# Altium footprint library Footprints.PcbLib: 105 footprints (part 6 of 7)
Each footprint in its own frame and in the unit in brackets; x right, y up, seen from the top. Pads: shape width x height; smd on the part's side, far side on the other; paste and mask are expansions set on the pad; w line width, h text height; cw(c..) or ccw(c..) is an arc to the next point about the centre after c.
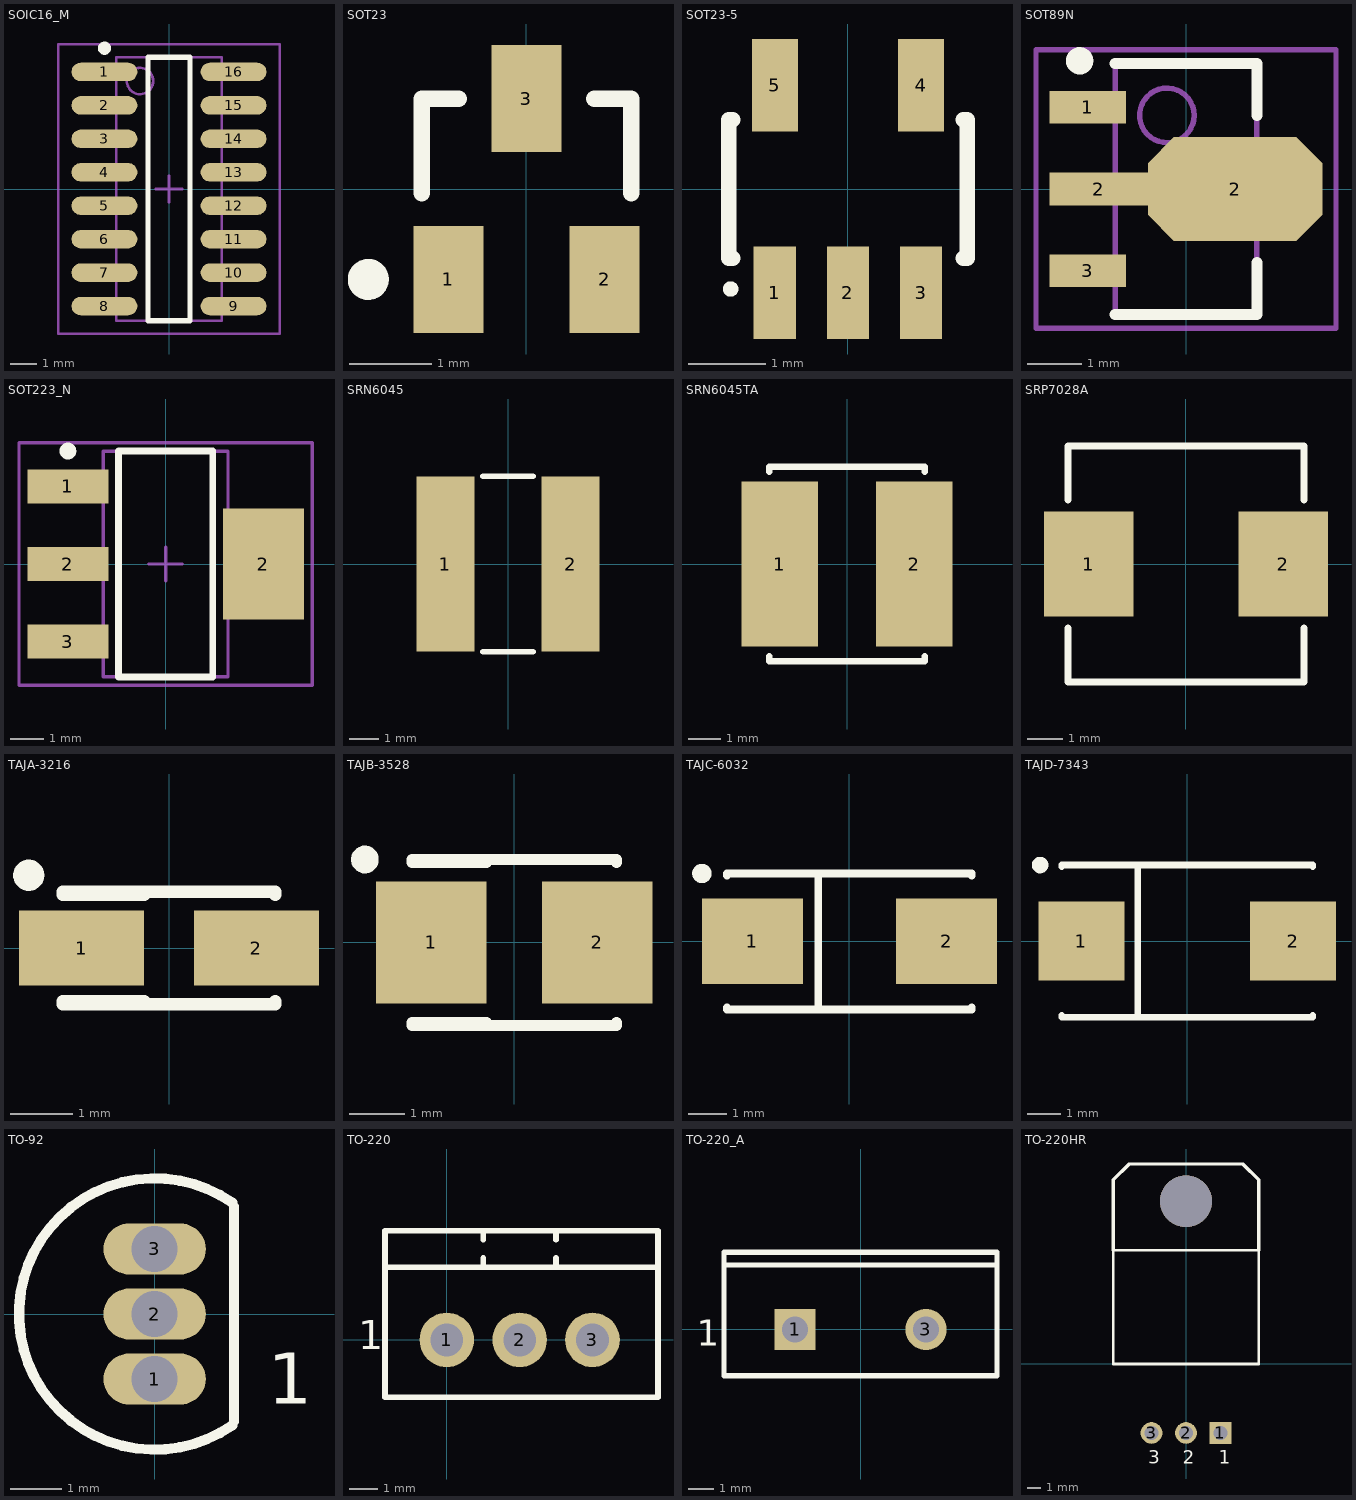
[diagram p5: the footprints below, top view; thin cyan lines are the x and y axes]

## SOIC16_M [mm] "SOIC, 16-Leads, Body 9.9x3.9mm, Pitch 1.27mm, IPC Low Density"
height 1.91
pads (16):
  oval 2.5x0.7 smd: 1(-2.45,4.445) 2(-2.45,3.175) 3(-2.45,1.905) 4(-2.45,0.635) 5(-2.45,-0.635) 6(-2.45,-1.905) 7(-2.45,-3.175) 8(-2.45,-4.445) 9(2.45,-4.445) 10(2.45,-3.175) 11(2.45,-1.905) 12(2.45,-0.635) 13(2.45,0.635) 14(2.45,1.905) 15(2.45,3.175) 16(2.45,4.445)
Top Overlay:
  circle w0.25: c-2.45,5.345 r0.125
  lines w0.2: -0.8,-5 0.8,-5 0.8,5 -0.8,5 -0.8,-5
Mechanical 13:
  circle w0.1: c-1.1,4.1 r0.5
  lines w0.1: -2,-5 2,-5 2,5 -2,5 -2,-5
Mechanical 15:
  lines w0.1: -0.5,0 0.5,0 ; 0,-0.5 0,0.5 ; -4.2,-5.5 4.2,-5.5 4.2,5.5 -4.2,5.5 -4.2,-5.5
3D body: height 1.91, standoff 0, extent -2,-5 2,5

## SOT23 [mm] "SOT-23; 3 Leads; Body 3.0 x 2.6 mm, inc. leads (LxW max)"
height 1.1
pads (3):
  rect 0.85x1.3 smd: 1(-0.95,-1.1) 2(0.95,-1.1) 3(0,1.1)
Top Overlay:
  circle w0.25: c-1.925,-1.1 r0.125
  lines w0.2: -1.275,-0.05 -1.275,1.1 -0.825,1.1 ; 0.825,1.1 1.275,1.1 1.275,-0.05
3D body "SOT-23.STEP": height 1.12, standoff 0.02, extent -1.502,-1.289 1.498,1.211

## SOT23-5 [mm] "SOT-23, 5 Leads; Body 3 x 3 mm, inc. leads (LxW max)"
height 1.1
pads (5):
  rect 0.55x1.2 smd: 1(-0.95,-1.35) 2(0,-1.35) 3(0.95,-1.35)
  rect 0.6x1.2 smd: 4(0.95,1.35) 5(-0.95,1.35)
Top Overlay:
  circle w0.1: c-1.525,-1.3 r0.05
  lines w0.2: -1.5,-0.9 -1.55,-0.9 -1.55,0.9 -1.5,0.9 ; 1.5,-0.9 1.55,-0.9 1.55,0.9 1.5,0.9

## SOT89N [mm] "SOT89, 3-Leads, Body 4.5x2.4 mm, Pitch 1.5mm, Lead Span 4.1mm, IPC Medium Density"
height 1.6
pads (4):
  rect 1.4x0.6 smd: 1(-1.8,1.5) 3(-1.8,-1.5)
  rect 1.8x0.6 smd: 2(-1.6,0)
  oct 3.2x1.9 smd: 2(0.9,0)
Top Overlay:
  circle w0.25: c-1.95,2.35 r0.125
  lines w0.2: -1.3,-2.3 1.3,-2.3 1.3,-1.35 ; -1.3,2.3 1.3,2.3 1.3,1.35
Mechanical 13:
  circle w0.1: c-0.35,1.35 r0.5
  lines w0.1: -1.3,-2.3 1.3,-2.3 1.3,2.3 -1.3,2.3 -1.3,-2.3
Mechanical 15:
  lines w0.1: -0.5,0 0.5,0 ; 0,-0.5 0,0.5 ; -2.75,-2.55 2.75,-2.55 2.75,2.55 -2.75,2.55 -2.75,-2.55
3D body: height 1.6, standoff 0, extent -1.3,-2.3 1.3,2.3

## SOT223_N [mm] "SOT223, 4-Leads, Body 6.5x3.5mm, Pitch 2.3mm, Lead Span 7mm, IPC Medium Density"
height 1.7
pads (4):
  rect 2.4x1 smd: 1(-2.9,2.3) 2(-2.9,0) 3(-2.9,-2.3)
  rect 2.4x3.3 smd: 2(2.9,0)
Top Overlay:
  circle w0.25: c-2.9,3.35 r0.125
  lines w0.2: -1.4,-3.35 -1.4,3.35 1.4,3.35 1.4,-3.35 -1.4,-3.35
Mechanical 13:
  lines w0.1: -1.85,-3.35 -1.85,3.35 1.85,3.35 1.85,-3.35 -1.85,-3.35
Mechanical 15:
  lines w0.1: -0.5,0 0.5,0 ; 0,-0.5 0,0.5 ; -4.35,-3.6 -4.35,3.6 4.35,3.6 4.35,-3.6 -4.35,-3.6
3D body: height 1.7, standoff 0, extent -1.85,-3.35 1.85,3.35

## SRN6045 [mm] "Semi-chielded Power Inductorss"
height 4.5
pads (2):
  rect 2x6 smd: 1(-2.15,0) 2(2.15,0)
Top Overlay:
  lines w0.2: -0.86,-3.01 0.86,-3.01 ; -0.86,3.01 0.86,3.01
3D body "SRN6045.stp": height 4.5, standoff 0, extent -3,-3 3,3

## SRN6045TA [mm]
pads (2):
  rect 2.35x5.1 smd: 1(-2.075,0) 2(2.075,0)
Top Overlay:
  lines w0.2: -2.4,-2.85 -2.4,-3 2.4,-3 2.4,-2.85 ; -2.4,2.85 -2.4,3 2.4,3 2.4,2.85
3D body "SRN6045TA.stp": height 3.95, standoff -0.01, extent -2.997,-2.997 2.997,2.997

## SRP7028A [mm] "Bourns Inductor"
height 2.8
pads (2):
  rect 2.5x2.95 smd: 1(-2.725,0) 2(2.725,0)
Top Overlay:
  lines w0.2: -3.3,-1.8 -3.3,-3.3 3.3,-3.3 3.3,-1.8 ; -3.3,1.8 -3.3,3.3 3.3,3.3 3.3,1.8
3D body "SRP 7028A series.stp": height 2.81, standoff -0.02, extent -3.45,-3.3 3.45,3.3

## TAJA-3216 [mm] "Capacitor, SM Tantalum; Body 3.2 x 1.6 mm (LxW typ)"
height 2.2
pads (2):
  rect 2x1.2 smd: 1(-1.4,0) 2(1.4,0)
Top Overlay:
  circle w0.25: c-2.245,1.165 r0.125
  lines w0.2: -1.7,-0.9 1.7,-0.9 1.7,-0.85 ; -1.7,-0.85 -0.4,-0.85 ; -1.7,0.85 -0.4,0.85 ; -1.7,0.9 1.7,0.9 1.7,0.85
3D body "Capacitor Tantalum TAJ-A.step": height 1.8, standoff -0.04, extent -2.398,-0.903 2.397,0.901

## TAJB-3528 [mm] "Capacitor, SM Tantalum; Body 3.5 x 2.8 mm (LxW typ)"
height 2.5
pads (2):
  rect 2x2.2 smd: 1(-1.5,0) 2(1.5,0)
Top Overlay:
  circle w0.25: c-2.7,1.5 r0.125
  lines w0.2: -1.85,-1.5 1.85,-1.5 1.85,-1.45 ; -1.85,-1.45 -0.5,-1.45 ; -1.85,1.45 -0.5,1.45 ; -1.85,1.5 1.85,1.5 1.85,1.45
3D body "Capacitor Tantalum TAJ-B.step": height 2.11, standoff -0.04, extent -2.504,-1.506 2.494,1.491

## TAJC-6032 [mm] "Capacitor, SM Tantalum; Body 6.0 x 3.2 mm (LxW typ)"
height 3.4
pads (2):
  rect 2.6x2.2 smd: 1(-2.5,0) 2(2.5,0)
Top Overlay:
  circle w0.25: c-3.8,1.75 r0.125
  lines w0.2: -3.15,-1.7 -3.15,-1.75 3.15,-1.75 3.15,-1.7 ; -3.15,1.7 -3.15,1.75 3.15,1.75 3.15,1.7 ; -0.8,-1.75 -0.8,1.75
3D body "Capacitor Tantalum TAJ-C.step": height 2.79, standoff -0.04, extent -3.798,-1.756 3.799,1.757

## TAJD-7343 [mm] "Capacitor, SM Tantalum; Body 7.3 x 4.3 mm (LxW typ)"
height 3.7
pads (2):
  rect 2.6x2.4 smd: 1(-3.2,0) 2(3.2,0)
Top Overlay:
  circle w0.25: c-4.45,2.3 r0.125
  lines w0.2: -3.8,-2.25 -3.8,-2.3 3.8,-2.3 3.8,-2.25 ; -3.8,2.25 -3.8,2.3 3.8,2.3 3.8,2.25 ; -1.5,-2.3 -1.5,2.3
3D body "Capacitor Tantalum TAJ-D.step": height 2.81, standoff 0.02, extent -3.752,-2.086 3.741,2.232

## TO-92 [mm] "TO, Flat Index; 3 In-Line, Axial Leads; Body Dia. 4.8mm; Leads 0.48 x 0.51 mm (max)"
height 5.33
pads (3):
  oval 2x1 hole 0.9: 1(0,-1.27) 2(0,0) 3(0,1.27)
Top Overlay:
  lines w0.2: 1.52,-2.171 cw(c0,0) 1.52,2.171 ; 1.55,-2.1 1.55,2.1
  text "1" at 2.21,-1.753 h1
3D body "ALSRobot-TO-92A.step": height 6, standoff -5, extent -2.4,-2.4 1.53,2.4

## TO-220 [mil]
pads (3):
  round 75 hole 45: 1(0,0) 2(100,0) 3(200,0)
Top Overlay:
  lines w7.87: -85,100 287.5,100 ; 50,100 50,112.5 ; 50,137.5 50,150 ; 150,100 150,112.5 ; 150,137.5 150,150 ; -85,-78.74 -85,150 290,150 290,-78.74 -85,-78.74
  text "1" at -122,-13 h39.37
3D body "SW3dPS-To220.STEP": height 751.97, standoff -383.86, extent -100,-68.98 300,120

## TO-220_A [mm] "TO, Thru-Hole, Vertical, Heatsink Mounted; 3 In-Line Leads (1 Absent); Pitch 2.54 mm"
height 19.3
pads (2):
  rect 1.6x1.6 hole 1: 1(-2.54,0)
  round 1.6 hole 1: 3(2.54,0)
Top Overlay:
  lines w0.2: -5.3,2.5 5.3,2.5 ; -5.3,-1.8 5.3,-1.8 5.3,3 -5.3,3 -5.3,-1.8
  text "1" at -6.35,-0.635 h1

## TO-220HR [mm] "TO, Thru-Hole, Horizontal Bottom Layer, Heatsink Mounted; 3 In-Line Leads; Pitch 2.54 mm"
height 4
pads (3):
  rect 1.6x1.6 hole 1: 1(2.54,-5.08)
  round 1.6 hole 1: 2(0,-5.08) 3(-2.54,-5.08)
via 0,12 diameter 3.8 hole 3.8
Top Overlay:
  lines w0.2: -5.35,0 5.35,0 5.35,8.382 -5.35,8.382 -5.35,0
  lines w0.254: -5.35,8.382 -5.35,13.573 -4.191,14.732 4.191,14.732 5.35,13.573 5.35,13.081 5.35,8.382
  text "3" at -2.794,-7.366 h1
  text "2" at -0.254,-7.366 h1
  text "1" at 2.413,-7.366 h1